# Altium footprint library Hydrolib_pcb.PcbLib: 102 footprints (part 3 of 7)
Each footprint in its own frame and in the unit in brackets; x right, y up, seen from the top. Pads: shape width x height; smd on the part's side, far side on the other; paste and mask are expansions set on the pad; w line width, h text height; cw(c..) or ccw(c..) is an arc to the next point about the centre after c.
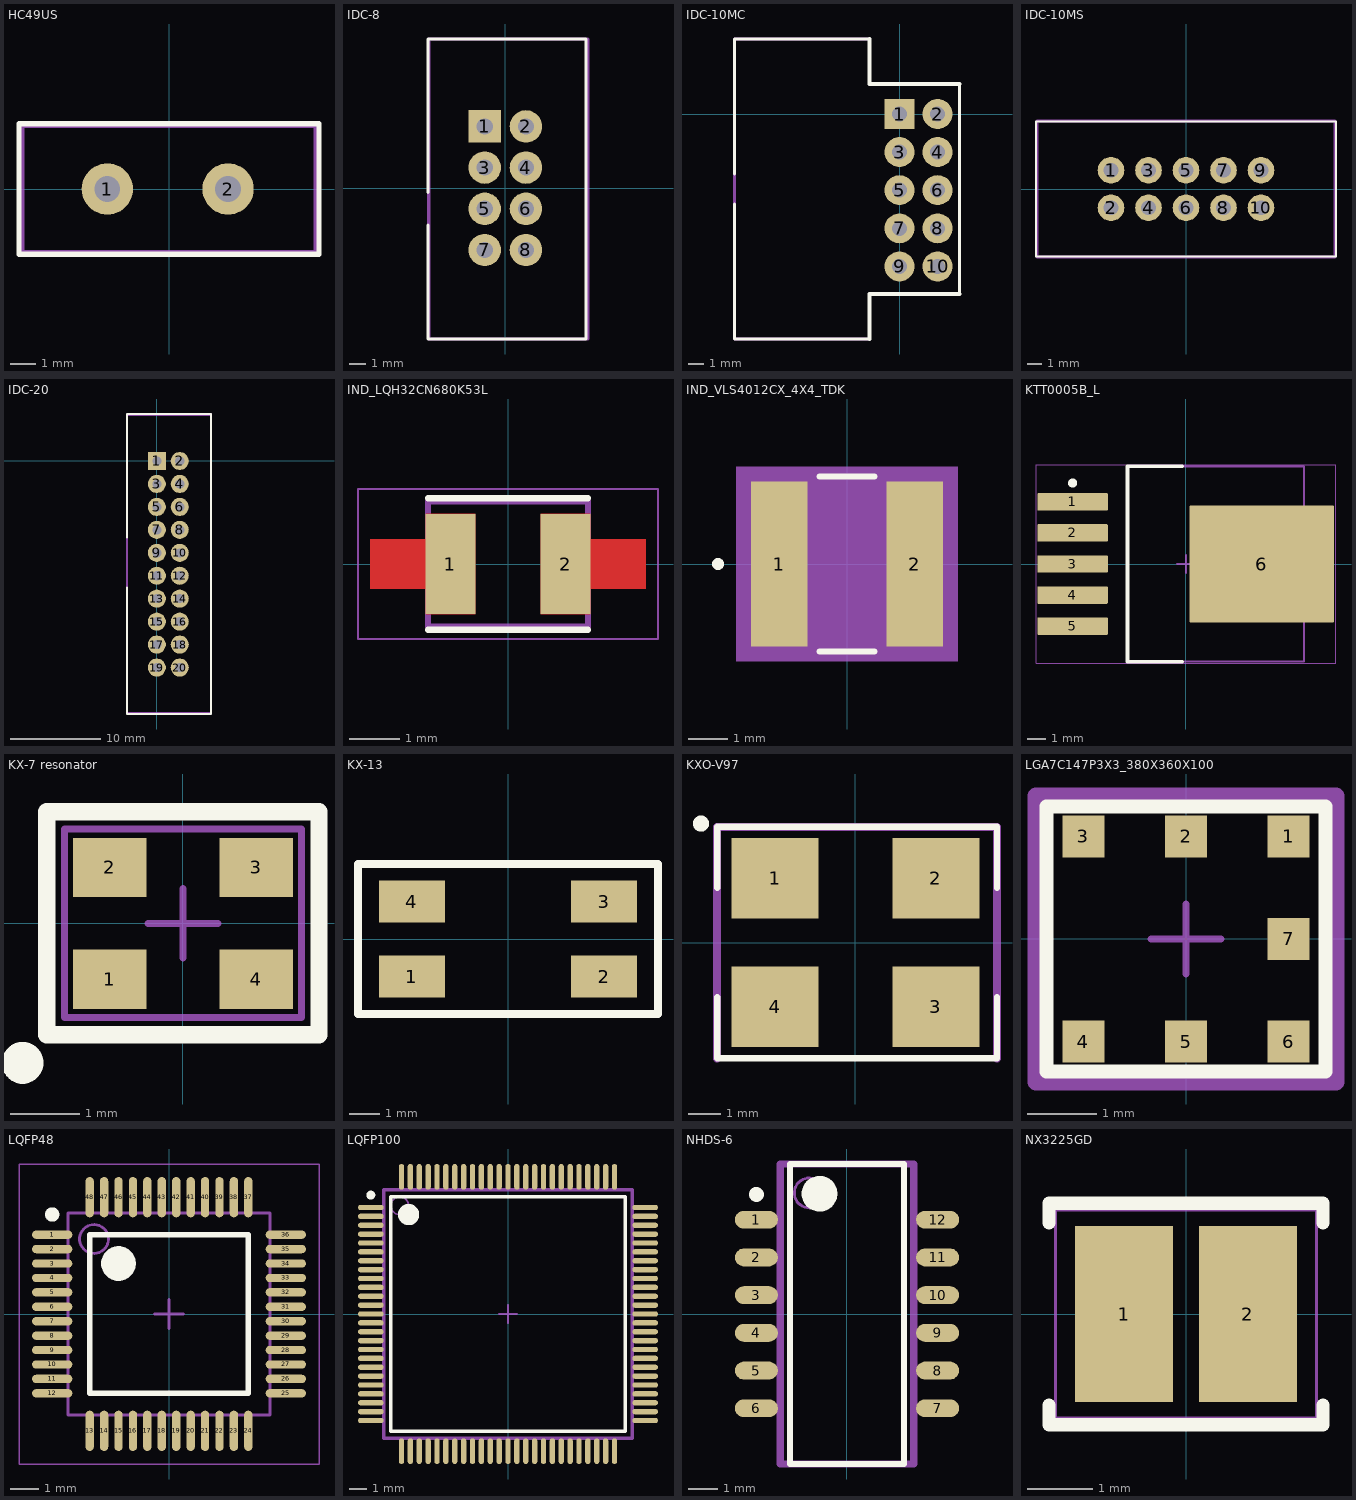
[diagram p2: the footprints below, top view; thin cyan lines are the x and y axes]

## HC49US [mm]
pads (2):
  round 2 hole 1: 1(-2.4,0) 2(2.3,0)
Top Overlay:
  lines w0.2: -5.842,-2.54 5.842,-2.54 5.842,2.54 -5.842,2.54 -5.842,-2.54
Pattern top:
  text ".Designator" at -4.1,3.5 h2.15
Pattern bot:
  lines w0.25: 5,-2.5 -5,-2.5 ; -5,-2.5 5.75,-2.5 5.75,2.5 5,2.5 -5,2.5 -5.75,2.5 -5.75,-2.5 -5,-2.5
3D body "XTAL-HP49US.STEP": height 3.5, standoff -3, extent -5.675,-2.25 5.675,2.4

## IDC-8 [mm] "IDC-8 Male Connector"
height 9
pads (8):
  rect 2x2 hole 1: 1(-1.27,3.81)
  round 2 hole 1: 2(1.27,3.81) 3(-1.27,1.27) 4(1.27,1.27) 5(-1.27,-1.27) 6(1.27,-1.27) 7(-1.27,-3.81) 8(1.27,-3.81)
Top Overlay:
  lines w0.2: -4.77,-2.265 -4.77,-9.3 4.98,-9.3 4.98,9.2 -4.77,9.2 -4.77,-0.265
Pattern top:
  lines w0.2: -4.72,-9.3 5.1,-9.3 5.1,9.2 -4.72,9.2 -4.72,-9.3
  text ".Designator" at -4.32,6.135 h2.15
3D body "User Library-DS1013-8S (IDC-8MS CONNFLY).sldprt": height 9, standoff -3.6, extent -4.4,-8.98 4.5,8.98

## IDC-10MC [mm] "IDC-14 Male Connector"
height 9
pads (10):
  rect 2x2 hole 1: 1(0,0)
  round 2 hole 1: 2(2.54,0) 3(0,-2.54) 4(2.54,-2.54) 5(0,-5.08) 6(2.54,-5.08) 7(0,-7.62) 8(2.54,-7.62) 9(0,-10.16) 10(2.54,-10.16)
Top Layer:
  lines w0.254: -0.254,0 0.254,0 ; 0,-0.254 0,0.254
Top Overlay:
  lines w0.2: -11,-6 -11,-15 -2,-15 ; -11,-4 -11,5 -2,5 ; 4,-12 4,2
  lines w0.254: -2,-15 -2,-12 4,-12 ; -2,5 -2,2 4,2
Template:
  lines w0.2: -11,-15 -2,-15 ; -11,5 -2,5
Pattern top:
  lines w0.2: -11,-15 -11,4.9 -10.9,5 -2,5 -2,2 4,2 4,-12 -2,-12 -2,-15 -11,-15
  text ".Designator" at -11,2.6 h2.15
3D body "IDC Male 10pin Angled 2_54mm.STEP": height 8.98, standoff -2.37, extent -10.735,-15.57 2.825,5.37

## IDC-10MS [mm]
pads (10):
  round 1.8 hole 1: 1(-5.08,1.27) 2(-5.08,-1.27) 3(-2.54,1.27) 4(-2.54,-1.27) 5(0,1.27) 6(0,-1.27) 7(2.54,1.27) 8(2.54,-1.27) 9(5.08,1.27) 10(5.08,-1.27)
Top Overlay:
  lines w0.15: -10.16,-4.572 -10.16,4.572 10.16,4.572 10.16,-4.572 -10.16,-4.572
Pattern top:
  lines w0.2: -10.1,-4.6 -10.1,4.6 10.1,4.6 10.1,-4.6 -10.1,-4.6
  text ".Designator" at -4.7,2.8 h2.15
3D body "User Library-BH-10__64BH-10.STEP": height 9.1, standoff -3, extent -10.25,-4.75 10.25,4.55

## IDC-20 [mm] "IDC-20 Male Connector"
height 9
pads (20):
  rect 2x2 hole 1: 1(0,0)
  round 2 hole 1: 2(2.54,0) 3(0,-2.54) 4(2.54,-2.54) 5(0,-5.08) 6(2.54,-5.08) 7(0,-7.62) 8(2.54,-7.62) 9(0,-10.16) 10(2.54,-10.16) 11(0,-12.7) 12(2.54,-12.7) 13(0,-15.24) 14(2.54,-15.24) 15(0,-17.78) 16(2.54,-17.78) 17(0,-20.32) 18(2.54,-20.32) 19(0,-22.86) 20(2.54,-22.86)
Top Overlay:
  lines w0.2: -3.3,-14 -3.3,-28 6,-28 6,5.2 -3.3,5.2 -3.3,-8.5
Pattern top:
  lines w0.2: -3.3,-27.9 6,-27.9 6,5.2 5.9,5.1 -3.3,5.1 -3.3,-27.9
  text ".Designator" at -3.2,2.3 h2.15
3D body "User Library-BH-10__64BH-20.STEP": height 9.1, standoff -3, extent -3.3,-28 6,5.2

## IND_LQH32CN680K53L [mm]
pads (2):
  rect 1x2 smd paste-2 mask+0: 1(-1.15,0) 2(1.15,0)
Top Layer:
  region: 1.65,0.5 2.75,0.5 2.75,-0.5 1.65,-0.5 1.65,-1 0.65,-1 0.65,1 1.65,1
  region: -0.65,-1 -1.65,-1 -1.65,-0.5 -2.75,-0.5 -2.75,0.5 -1.65,0.5 -1.65,1 -0.65,1
Top Overlay:
  lines w0.127: -1.6,-1.314 1.6,-1.314 ; -1.6,1.314 1.6,1.314
Top Paste:
  region: 1.65,0.5 2.75,0.5 2.75,-0.5 1.65,-0.5 1.65,-1 0.65,-1 0.65,1 1.65,1
  region: -0.65,-1 -1.65,-1 -1.65,-0.5 -2.75,-0.5 -2.75,0.5 -1.65,0.5 -1.65,1 -0.65,1
Top Solder:
  region: 1.75,0.6 2.85,0.6 2.85,-0.6 1.75,-0.6 1.75,-1.1 0.55,-1.1 0.55,1.1 1.75,1.1
  region: -0.55,-1.1 -1.75,-1.1 -1.75,-0.6 -2.85,-0.6 -2.85,0.6 -1.75,0.6 -1.75,1.1 -0.55,1.1
Mechanical 13:
  lines w0.127: -1.6,-1.25 -1.6,1.25 1.6,1.25 1.6,-1.25 -1.6,-1.25
Mechanical 15:
  lines w0.05: -3,-1.5 -3,1.5 3,1.5 3,-1.5 -3,-1.5

## IND_VLS4012CX_4X4_TDK [mil]
pads (2):
  rect 56.78x165 smd paste+0 mask+0: 1(-67.89,0) 2(67.89,0)
Top Overlay:
  circle w6: c-129.28,0 r3
  lines w6: -27.39,-87.5 27.39,-87.5 ; -27.39,87.5 27.39,87.5
Pattern bot:
  region: 111.28,-97.5 -111.28,-97.5 -111.28,97.5 111.28,97.5
Mechanical 13:
  circle w0: c-62.89,0 r3
  lines w1: -82.5,-82.5 -82.5,82.5 ; -82.5,-82.5 82.5,-82.5 ; -82.5,-82.5 -39.5,-82.5 -39.5,82.5 -82.5,82.5 ; -82.5,-82.5 -82.5,82.5 ; -82.5,82.5 82.5,82.5 ; 82.5,-82.5 82.5,82.5 ; 82.5,-82.5 82.5,82.5 ; 82.5,-82.5 39.5,-82.5 39.5,82.5 82.5,82.5
Mechanical 15:
  region: 106.28,-92.5 -106.28,-92.5 -106.28,92.5 106.28,92.5
  lines w6: -106.28,-92.5 106.28,-92.5 106.28,92.5 -106.28,92.5 -106.28,-92.5
3D body "IND_VLS4012CX_4X4_TDK.step": height 47.01, standoff 0, extent -82.52,-82.52 82.52,82.52

## KTT0005B_L [mm] "DPAK, 5-Leads, Body 10.65x9.65mm, Pitch 1.7mm, IPC High Density"
height 4.83
pads (6):
  rrect11% 3.85x0.95 smd: 1(-6.2,3.4) 2(-6.2,1.7) 3(-6.2,0) 4(-6.2,-1.7) 5(-6.2,-3.4)
  rrect2% 7.9x6.4 smd: 6(4.15,0)
Top Overlay:
  circle w0.25: c-6.2,4.425 r0.125
  lines w0.2: -0.2,-5.35 -3.2,-5.35 -3.2,5.35 -0.2,5.35
Template:
  text ".Designator" at -1.905,-0.508 h1.3
Mechanical 13:
  lines w0.1: -3.2,-5.325 6.45,-5.325 6.45,5.325 -3.2,5.325 -3.2,-5.325
Mechanical 15:
  lines w0.05: -8.2,-5.425 8.2,-5.425 8.2,5.425 -8.2,5.425 -8.2,-5.425
  lines w0.1: -0.5,0 0.5,0 ; 0,-0.5 0,0.5
3D body: height 4.83, standoff 0, extent -3.2,-5.325 6.45,5.325

## KX-7 resonator [mm] "DFN, 4-Leads, Body 2,50x3,20mm, Pitch 2,10mm, IPC Medium Density"
height 0.8
pads (4):
  rect 1.05x0.85 smd: 1(-1.05,-0.8) 2(-1.05,0.8) 3(1.05,0.8) 4(1.05,-0.8)
Top Overlay:
  circle w0.5: c-2.3,-2 r0.05
  lines w0.25: -1.95,-1.6 1.95,-1.6 1.95,1.6 -1.95,1.6 -1.95,-1.6
Mechanical 13:
  lines w0.1: -1.7,-1.35 1.7,-1.35 1.7,1.35 -1.7,1.35 -1.7,-1.35
Mechanical 15:
  lines w0.1: -0.5,0 0.5,0 ; 0,-0.5 0,0.5
3D body "DFN210P320X80-4N.step": height 0.8, standoff 0, extent -1.8,-1.35 1.7,1.35

## KX-13 [mm]
pads (4):
  rect 2.2x1.4 smd: 1(-3.2,-1.25) 2(3.2,-1.25) 3(3.2,1.25) 4(-3.2,1.25)
Top Overlay:
  lines w0.254: -5,-2.5 5,-2.5 5,2.5 -5,2.5 -5,-2.5
Pattern top:
  lines w0.25: -5,-2.5 -5,2.5 5,2.5 5,-2.5 -5,-2.5
  text ".Designator" at -4.4,3.4 h2.15
3D body "User Library-KX-13 7,37280.STEP": height 1.29, standoff -0.01, extent -3.5,-2.6 3.5,2.4

## KXO-V97 [mm]
pads (4):
  rect 2.7x2.5 smd: 1(-2.5,2) 2(2.5,2) 3(2.5,-2) 4(-2.5,-2)
Top Overlay:
  circle w0.25: c-4.8,3.7 r0.125
  lines w0.2: -4.3,-1.7 -4.3,-3.6 4.4,-3.6 4.4,-1.7 ; -4.3,1.7 -4.3,3.6 4.4,3.6 4.4,1.7
Pattern top:
  lines w0.25: -4.3,-3.6 -4.3,3.6 4.4,3.6 4.4,-3.6
  text ".Designator" at 0,0 h1.52

## LGA7C147P3X3_380X360X100 [mm] "LGA, 7-Leads, Body 3,80x3,60mmx1,00mm, Pitch 1,47mm"
height 1
pads (7):
  rect 0.6x0.6 smd: 1(1.47,1.47) 2(0,1.47) 3(-1.47,1.47) 4(-1.47,-1.47) 5(0,-1.47) 6(1.47,-1.47) 7(1.47,0)
Top Overlay:
  lines w0.2: -2,-1.9 -2,1.9 2,1.9 2,-1.9 -2,-1.9
Pattern top:
  lines w0.1: -0.5,0 0.5,0 ; 0,-0.5 0,0.5
  lines w0.25: -2.15,-2.05 2.15,-2.05 2.15,2.05 -2.15,2.05 -2.15,-2.05
  text ".Designator" at -1.2,3 h2.13
3D body "LGA7C147P3X3_380X360X100.step": height 1, standoff 0, extent -1.95,-1.85 1.95,1.85

## LQFP48 [mm] "TSQFP, 48-Leads, Body 7,00x7,00mm, Pitch 0,50mm, IPC Medium Density"
height 1.6
pads (48):
  oval 1.4x0.29 smd: 1(-4.05,2.75) 2(-4.05,2.25) 3(-4.05,1.75) 4(-4.05,1.25) 5(-4.05,0.75) 6(-4.05,0.25) 7(-4.05,-0.25) 8(-4.05,-0.75) 9(-4.05,-1.25) 10(-4.05,-1.75) 11(-4.05,-2.25) 12(-4.05,-2.75)
  oval 0.29x1.4 smd paste+0 mask+0.09: 13(-2.75,-4.05) 14(-2.25,-4.05) 15(-1.75,-4.05) 16(-1.25,-4.05) 17(-0.75,-4.05) 18(-0.25,-4.05) 19(0.25,-4.05) 20(0.75,-4.05) 21(1.25,-4.05) 22(1.75,-4.05) 23(2.25,-4.05) 24(2.75,-4.05) 37(2.75,4.05) 38(2.25,4.05) 39(1.75,4.05) 40(1.25,4.05) 41(0.75,4.05) 42(0.25,4.05) 43(-0.25,4.05) 44(-0.75,4.05) 45(-1.25,4.05) 46(-1.75,4.05) 47(-2.25,4.05) 48(-2.75,4.05)
  oval 1.4x0.29 smd paste+0 mask+0.09: 25(4.05,-2.75) 26(4.05,-2.25) 27(4.05,-1.75) 28(4.05,-1.25) 29(4.05,-0.75) 30(4.05,-0.25) 31(4.05,0.25) 32(4.05,0.75) 33(4.05,1.25) 34(4.05,1.75) 35(4.05,2.25) 36(4.05,2.75)
Top Overlay:
  circle w0.25: c-4.05,3.45 r0.125
  circle w0.6: c-1.75,1.75 r0.3
  lines w0.2: -2.75,-2.75 -2.75,2.75 2.75,2.75 2.75,-2.75 -2.75,-2.75
Template:
  circle w0.1: c-2.6,2.6 r0.5
  lines w0.1: -3.5,-3.5 -3.5,3.5 3.5,3.5 3.5,-3.5 -3.5,-3.5
Mechanical 15:
  lines w0.05: -5.2,-5.2 -5.2,5.2 5.2,5.2 5.2,-5.2 -5.2,-5.2
  lines w0.1: -0.5,0 0.5,0 ; 0,-0.5 0,0.5
3D body "stm32f103c8t6.stp": height 1.48, standoff 0, extent -4.5,-4.475 4.5,4.525

## LQFP100 [mm] "TSQFP, 100-Leads, Body 14,00x14,00mm, Pitch 0,50mm, IPC Medium Density"
height 1.6
pads (100):
  oval 1.45x0.3 smd: 1(-7.725,6) 2(-7.725,5.5) 3(-7.725,5) 4(-7.725,4.5) 5(-7.725,4) 6(-7.725,3.5) 7(-7.725,3) 8(-7.725,2.5) 9(-7.725,2) 10(-7.725,1.5) 11(-7.725,1) 12(-7.725,0.5) 13(-7.725,0) 14(-7.725,-0.5) 15(-7.725,-1) 16(-7.725,-1.5) 17(-7.725,-2) 18(-7.725,-2.5) 19(-7.725,-3) 20(-7.725,-3.5) 21(-7.725,-4) 22(-7.725,-4.5) 23(-7.725,-5) 24(-7.725,-5.5) 25(-7.725,-6) 51(7.725,-6) 52(7.725,-5.5) 53(7.725,-5) 54(7.725,-4.5) 55(7.725,-4) 56(7.725,-3.5) 57(7.725,-3) 58(7.725,-2.5) 59(7.725,-2) 60(7.725,-1.5) 61(7.725,-1) 62(7.725,-0.5) 63(7.725,0) 64(7.725,0.5) 65(7.725,1) 66(7.725,1.5) 67(7.725,2) 68(7.725,2.5) 69(7.725,3) 70(7.725,3.5) 71(7.725,4) 72(7.725,4.5) 73(7.725,5) 74(7.725,5.5) 75(7.725,6)
  oval 0.3x1.45 smd: 26(-6,-7.725) 27(-5.5,-7.725) 28(-5,-7.725) 29(-4.5,-7.725) 30(-4,-7.725) 31(-3.5,-7.725) 32(-3,-7.725) 33(-2.5,-7.725) 34(-2,-7.725) 35(-1.5,-7.725) 36(-1,-7.725) 37(-0.5,-7.725) 38(0,-7.725) 39(0.5,-7.725) 40(1,-7.725) 41(1.5,-7.725) 42(2,-7.725) 43(2.5,-7.725) 44(3,-7.725) 45(3.5,-7.725) 46(4,-7.725) 47(4.5,-7.725) 48(5,-7.725) 49(5.5,-7.725) 50(6,-7.725) 76(6,7.725) 77(5.5,7.725) 78(5,7.725) 79(4.5,7.725) 80(4,7.725) 81(3.5,7.725) 82(3,7.725) 83(2.5,7.725) 84(2,7.725) 85(1.5,7.725) 86(1,7.725) 87(0.5,7.725) 88(0,7.725) 89(-0.5,7.725) 90(-1,7.725) 91(-1.5,7.725) 92(-2,7.725) 93(-2.5,7.725) 94(-3,7.725) 95(-3.5,7.725) 96(-4,7.725) 97(-4.5,7.725) 98(-5,7.725) 99(-5.5,7.725) 100(-6,7.725)
Top Overlay:
  circle w0.6: c-5.6,5.6 r0.3
  circle w0.25: c-7.725,6.7 r0.125
  lines w0.2: -6.6,-6.6 6.6,-6.6 6.6,6.6 -6.6,6.6 -6.6,-6.6
Pattern top:
  lines w0.2: -7,-7 7,-7 7,7 -7,7 -7,-7
Mechanical 13:
  circle w0.1: c-6.1,6.1 r0.5
Mechanical 15:
  lines w0.1: -0.5,0 0.5,0 ; 0,-0.5 0,0.5
3D body "LQFP100.step": height 1.6, standoff 0, extent -8,-8 8,8

## NHDS-6 [mm] "DIP-switch 6 pin"
height 2.3
pads (12):
  oval 1.45x0.6 smd: 1(-3.05,3.175) 2(-3.05,1.905) 3(-3.05,0.635) 4(-3.05,-0.635) 5(-3.05,-1.905) 6(-3.05,-3.175) 7(3.05,-3.175) 8(3.05,-1.905) 9(3.05,-0.635) 10(3.05,0.635) 11(3.05,1.905) 12(3.05,3.175)
Top Overlay:
  circle w0.25: c-3.05,4.025 r0.125
  circle w0.6: c-0.925,4.05 r0.3
  lines w0.2: -1.925,-5.05 -1.925,5.05 1.925,5.05 1.925,-5.05 -1.925,-5.05
Mechanical 13:
  circle w0.1: c-1.275,4.075 r0.5
  lines w0.25: -2.25,-5.05 -2.25,5.05 2.25,5.05 2.25,-5.05 -2.25,-5.05
3D body "NHDS-6.STEP": height 2.3, standoff 0, extent -3.4,-5.05 3.3,5.05

## NX3225GD [mm]
pads (2):
  rect 1.5x2.7 smd: 1(-0.95,0) 2(0.95,0)
Top Overlay:
  lines w0.203: -2.1,-1.4 -2.1,-1.7 2.1,-1.7 2.1,-1.4 ; -2.1,1.4 -2.1,1.7 2.1,1.7 2.1,1.4
Mechanical 13:
  lines w0.051: -2,-1.6 2,-1.6 2,1.6 -2,1.6 -2,-1.6